# Altium footprint library ref-packages.PCBLIB: 1544 footprints (part 62 of 103)
Each footprint in its own frame and in the unit in brackets; x right, y up, seen from the top. Pads: shape width x height; smd on the part's side, far side on the other; paste and mask are expansions set on the pad; w line width, h text height; cw(c..) or ccw(c..) is an arc to the next point about the centre after c.
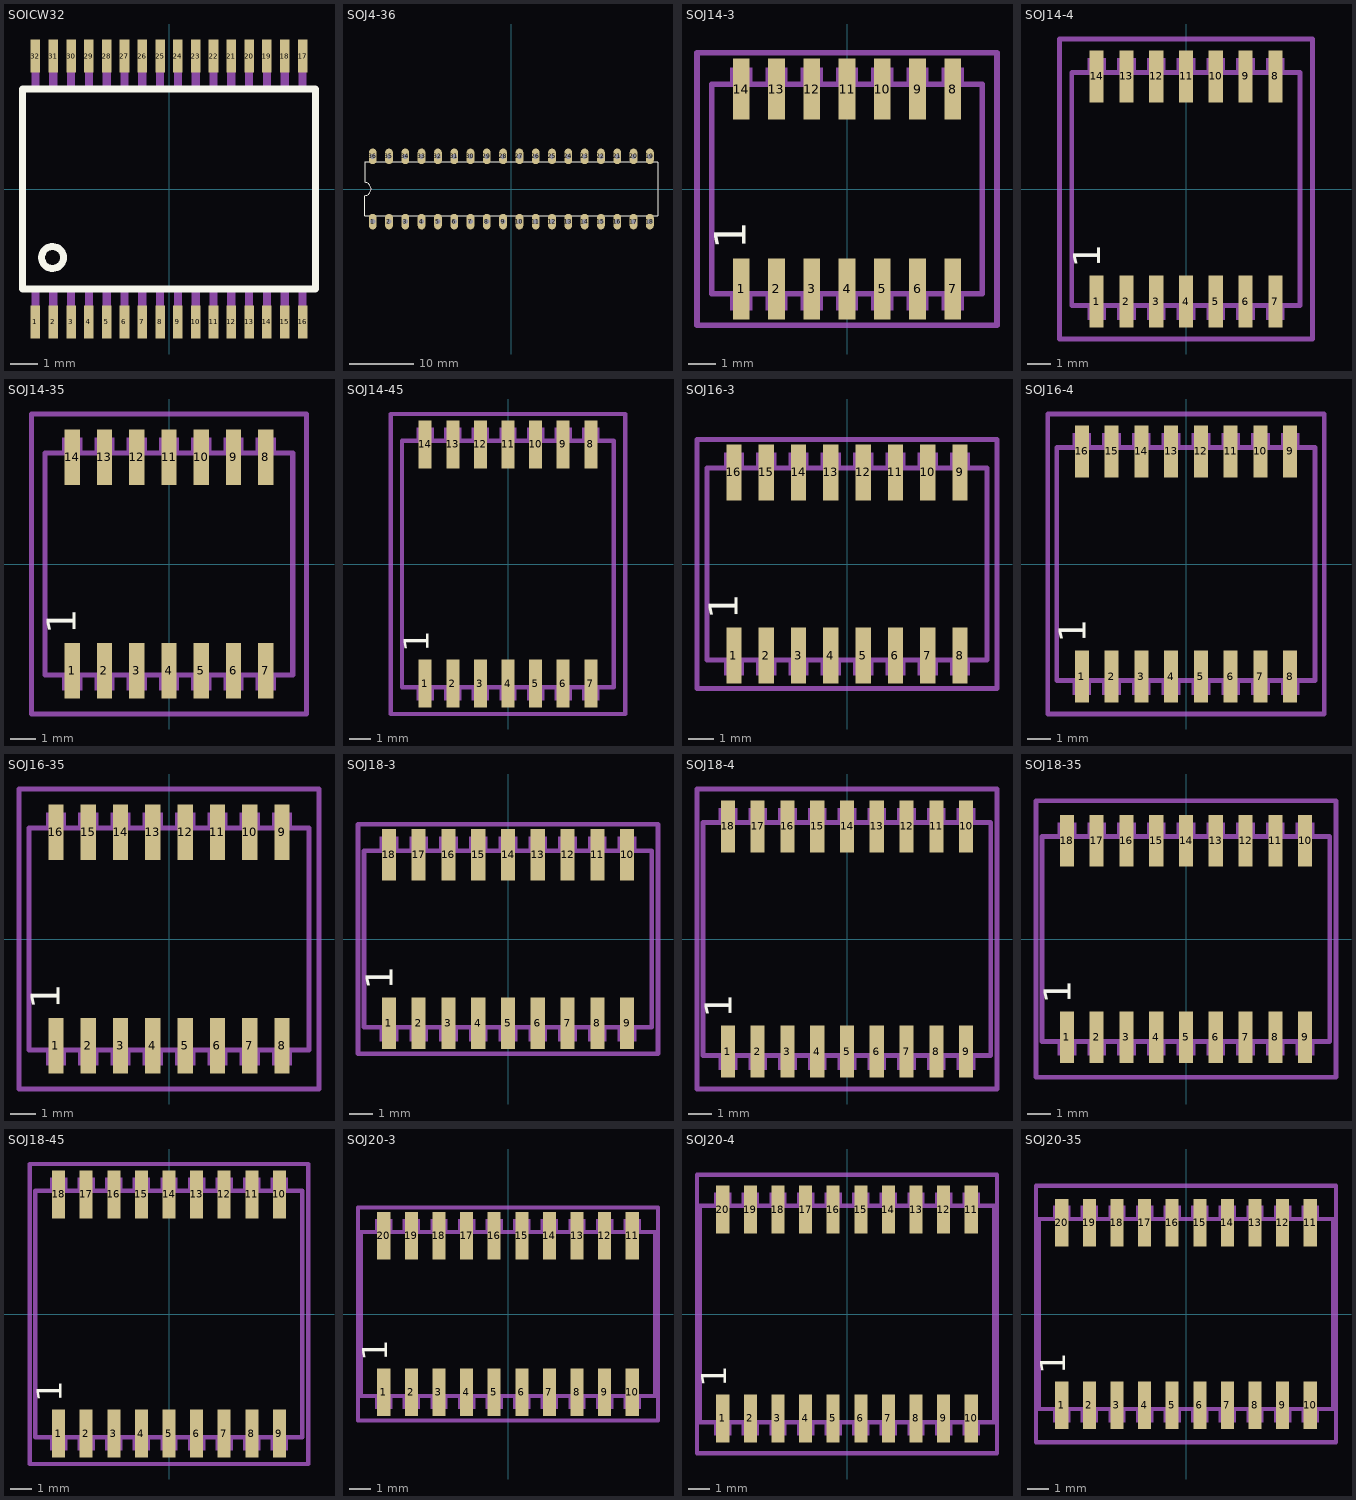
[diagram p61: the footprints below, top view; thin cyan lines are the x and y axes]

## SOICW32 [mm]
pads (32):
  rect 0.35x1.2 smd: 1(-4.875,-4.85) 2(-4.225,-4.85) 3(-3.575,-4.85) 4(-2.925,-4.85) 5(-2.275,-4.85) 6(-1.625,-4.85) 7(-0.975,-4.85) 8(-0.325,-4.85) 9(0.325,-4.85) 10(0.975,-4.85) 11(1.625,-4.85) 12(2.275,-4.85) 13(2.925,-4.85) 14(3.575,-4.85) 15(4.225,-4.85) 16(4.875,-4.85) 17(4.875,4.85) 18(4.225,4.85) 19(3.575,4.85) 20(2.925,4.85) 21(2.275,4.85) 22(1.625,4.85) 23(0.975,4.85) 24(0.325,4.85) 25(-0.325,4.85) 26(-0.975,4.85) 27(-1.625,4.85) 28(-2.275,4.85) 29(-2.925,4.85) 30(-3.575,4.85) 31(-4.225,4.85) 32(-4.875,4.85)
Top Overlay:
  circle w0.254: c-4.25,-2.5 r0.4
  lines w0.254: -5.35,-3.65 5.35,-3.65 5.35,3.65 -5.35,3.65 -5.35,-3.65
Mechanical 16:
  rectangle: -5.025,-5.15 -4.725,-3.75
  rectangle: -4.375,-5.15 -4.075,-3.75
  rectangle: -3.725,-5.15 -3.425,-3.75
  rectangle: -3.075,-5.15 -2.775,-3.75
  rectangle: -2.425,-5.15 -2.125,-3.75
  rectangle: -1.775,-5.15 -1.475,-3.75
  rectangle: -1.125,-5.15 -0.825,-3.75
  rectangle: -0.475,-5.15 -0.175,-3.75
  rectangle: 0.175,-5.15 0.475,-3.75
  rectangle: 0.825,-5.15 1.125,-3.75
  rectangle: 1.475,-5.15 1.775,-3.75
  rectangle: 2.125,-5.15 2.425,-3.75
  rectangle: 2.775,-5.15 3.075,-3.75
  rectangle: 3.425,-5.15 3.725,-3.75
  rectangle: 4.075,-5.15 4.375,-3.75
  rectangle: 4.725,-5.15 5.025,-3.75
  rectangle: 4.725,3.75 5.025,5.15
  rectangle: 4.075,3.75 4.375,5.15
  rectangle: 3.425,3.75 3.725,5.15
  rectangle: 2.775,3.75 3.075,5.15
  rectangle: 2.125,3.75 2.425,5.15
  rectangle: 1.475,3.75 1.775,5.15
  rectangle: 0.825,3.75 1.125,5.15
  rectangle: 0.175,3.75 0.475,5.15
  rectangle: -0.475,3.75 -0.175,5.15
  rectangle: -1.125,3.75 -0.825,5.15
  rectangle: -1.775,3.75 -1.475,5.15
  rectangle: -2.425,3.75 -2.125,5.15
  rectangle: -3.075,3.75 -2.775,5.15
  rectangle: -3.725,3.75 -3.425,5.15
  rectangle: -4.375,3.75 -4.075,5.15
  rectangle: -5.025,3.75 -4.725,5.15

## SOJ4-36 [mil]
pads (36):
  oval 48x96 hole 32: 1(-850,-200) 2(-750,-200) 3(-650,-200) 4(-550,-200) 5(-450,-200) 6(-350,-200) 7(-250,-200) 8(-150,-200) 9(-50,-200) 10(50,-200) 11(150,-200) 12(250,-200) 13(350,-200) 14(450,-200) 15(550,-200) 16(650,-200) 17(750,-200) 18(850,-200) 19(850,200) 20(750,200) 21(650,200) 22(550,200) 23(450,200) 24(350,200) 25(250,200) 26(150,200) 27(50,200) 28(-50,200) 29(-150,200) 30(-250,200) 31(-350,200) 32(-450,200) 33(-550,200) 34(-650,200) 35(-750,200) 36(-850,200)
Top Overlay:
  lines w6: -900,-165 900,-165 900,165 -900,165 -900,40 cw(c-900,0) -900,-40 -900,-165

## SOJ14-3 [mil]
pads (14):
  rect 23.62x86.61 smd: 1(-150,-141.73) 2(-100,-141.73) 3(-50,-141.73) 4(0,-141.73) 5(50,-141.73) 6(100,-141.73) 7(150,-141.73) 8(150,141.73) 9(100,141.73) 10(50,141.73) 11(0,141.73) 12(-50,141.73) 13(-100,141.73) 14(-150,141.73)
Top Overlay:
  text "1" at -128.54,-85.43 h77.5
Mechanical 16:
  rectangle: -159.84,-144.49 -140.16,-99.61
  rectangle: -165.75,-172.44 -134.25,-152.36
  rectangle: -109.84,-144.49 -90.16,-99.61
  rectangle: -115.75,-172.44 -84.25,-152.36
  rectangle: -59.84,-144.49 -40.16,-99.61
  rectangle: -65.75,-172.44 -34.25,-152.36
  rectangle: -9.84,-144.49 9.84,-99.61
  rectangle: -15.75,-172.44 15.75,-152.36
  rectangle: 40.16,-144.49 59.84,-99.61
  rectangle: 34.25,-172.44 65.75,-152.36
  rectangle: 90.16,-144.49 109.84,-99.61
  rectangle: 84.25,-172.44 115.75,-152.36
  rectangle: 140.16,-144.49 159.84,-99.61
  rectangle: 134.25,-172.44 165.75,-152.36
  rectangle: 140.16,99.61 159.84,144.49
  rectangle: 134.25,152.36 165.75,172.44
  rectangle: 90.16,99.61 109.84,144.49
  rectangle: 84.25,152.36 115.75,172.44
  rectangle: 40.16,99.61 59.84,144.49
  rectangle: 34.25,152.36 65.75,172.44
  rectangle: -9.84,99.61 9.84,144.49
  rectangle: -15.75,152.36 15.75,172.44
  rectangle: -59.84,99.61 -40.16,144.49
  rectangle: -65.75,152.36 -34.25,172.44
  rectangle: -109.84,99.61 -90.16,144.49
  rectangle: -115.75,152.36 -84.25,172.44
  rectangle: -159.84,99.61 -140.16,144.49
  rectangle: -165.75,152.36 -134.25,172.44
  lines w8: -191.93,-148.43 191.54,-148.43 191.54,148.43 -191.93,148.43 -191.93,-148.43
Mechanical 27:
  lines w7.87: -212.6,-192.91 -212.6,192.91 212.6,192.91 212.6,-192.91 -212.6,-192.91

## SOJ14-4 [mil]
pads (14):
  rect 23.62x86.61 smd: 1(-150,-188.98) 2(-100,-188.98) 3(-50,-188.98) 4(0,-188.98) 5(50,-188.98) 6(100,-188.98) 7(150,-188.98) 8(150,188.98) 9(100,188.98) 10(50,188.98) 11(0,188.98) 12(-50,188.98) 13(-100,188.98) 14(-150,188.98)
Top Overlay:
  text "1" at -128.54,-132.68 h77.5
Mechanical 16:
  rectangle: -159.84,-191.73 -140.16,-146.85
  rectangle: -165.75,-219.69 -134.25,-199.61
  rectangle: -109.84,-191.73 -90.16,-146.85
  rectangle: -115.75,-219.69 -84.25,-199.61
  rectangle: -59.84,-191.73 -40.16,-146.85
  rectangle: -65.75,-219.69 -34.25,-199.61
  rectangle: -9.84,-191.73 9.84,-146.85
  rectangle: -15.75,-219.69 15.75,-199.61
  rectangle: 40.16,-191.73 59.84,-146.85
  rectangle: 34.25,-219.69 65.75,-199.61
  rectangle: 90.16,-191.73 109.84,-146.85
  rectangle: 84.25,-219.69 115.75,-199.61
  rectangle: 140.16,-191.73 159.84,-146.85
  rectangle: 134.25,-219.69 165.75,-199.61
  rectangle: 140.16,146.85 159.84,191.73
  rectangle: 134.25,199.61 165.75,219.69
  rectangle: 90.16,146.85 109.84,191.73
  rectangle: 84.25,199.61 115.75,219.69
  rectangle: 40.16,146.85 59.84,191.73
  rectangle: 34.25,199.61 65.75,219.69
  rectangle: -9.84,146.85 9.84,191.73
  rectangle: -15.75,199.61 15.75,219.69
  rectangle: -59.84,146.85 -40.16,191.73
  rectangle: -65.75,199.61 -34.25,219.69
  rectangle: -109.84,146.85 -90.16,191.73
  rectangle: -115.75,199.61 -84.25,219.69
  rectangle: -159.84,146.85 -140.16,191.73
  rectangle: -165.75,199.61 -134.25,219.69
  lines w8: -191.93,-195.67 191.54,-195.67 191.54,195.67 -191.93,195.67 -191.93,-195.67
Mechanical 27:
  lines w7.87: -212.6,-251.97 -212.6,251.97 212.6,251.97 212.6,-251.97 -212.6,-251.97

## SOJ14-35 [mil]
pads (14):
  rect 23.62x86.61 smd: 1(-150,-165.35) 2(-100,-165.35) 3(-50,-165.35) 4(0,-165.35) 5(50,-165.35) 6(100,-165.35) 7(150,-165.35) 8(150,165.35) 9(100,165.35) 10(50,165.35) 11(0,165.35) 12(-50,165.35) 13(-100,165.35) 14(-150,165.35)
Top Overlay:
  text "1" at -128.54,-109.06 h77.5
Mechanical 16:
  rectangle: -159.84,-168.11 -140.16,-123.23
  rectangle: -165.75,-196.06 -134.25,-175.98
  rectangle: -109.84,-168.11 -90.16,-123.23
  rectangle: -115.75,-196.06 -84.25,-175.98
  rectangle: -59.84,-168.11 -40.16,-123.23
  rectangle: -65.75,-196.06 -34.25,-175.98
  rectangle: -9.84,-168.11 9.84,-123.23
  rectangle: -15.75,-196.06 15.75,-175.98
  rectangle: 40.16,-168.11 59.84,-123.23
  rectangle: 34.25,-196.06 65.75,-175.98
  rectangle: 90.16,-168.11 109.84,-123.23
  rectangle: 84.25,-196.06 115.75,-175.98
  rectangle: 140.16,-168.11 159.84,-123.23
  rectangle: 134.25,-196.06 165.75,-175.98
  rectangle: 140.16,123.23 159.84,168.11
  rectangle: 134.25,175.98 165.75,196.06
  rectangle: 90.16,123.23 109.84,168.11
  rectangle: 84.25,175.98 115.75,196.06
  rectangle: 40.16,123.23 59.84,168.11
  rectangle: 34.25,175.98 65.75,196.06
  rectangle: -9.84,123.23 9.84,168.11
  rectangle: -15.75,175.98 15.75,196.06
  rectangle: -59.84,123.23 -40.16,168.11
  rectangle: -65.75,175.98 -34.25,196.06
  rectangle: -109.84,123.23 -90.16,168.11
  rectangle: -115.75,175.98 -84.25,196.06
  rectangle: -159.84,123.23 -140.16,168.11
  rectangle: -165.75,175.98 -134.25,196.06
  lines w8: -191.93,-172.05 191.54,-172.05 191.54,172.05 -191.93,172.05 -191.93,-172.05
Mechanical 27:
  lines w7.87: -212.6,-232.28 -212.6,232.28 212.6,232.28 212.6,-232.28 -212.6,-232.28

## SOJ14-45 [mil]
pads (14):
  rect 23.62x86.61 smd: 1(-150,-216.54) 2(-100,-216.54) 3(-50,-216.54) 4(0,-216.54) 5(50,-216.54) 6(100,-216.54) 7(150,-216.54) 8(150,216.54) 9(100,216.54) 10(50,216.54) 11(0,216.54) 12(-50,216.54) 13(-100,216.54) 14(-150,216.54)
Top Overlay:
  text "1" at -128.54,-160.24 h77.5
Mechanical 16:
  rectangle: -159.84,-219.29 -140.16,-174.41
  rectangle: -165.75,-247.24 -134.25,-227.17
  rectangle: -109.84,-219.29 -90.16,-174.41
  rectangle: -115.75,-247.24 -84.25,-227.17
  rectangle: -59.84,-219.29 -40.16,-174.41
  rectangle: -65.75,-247.24 -34.25,-227.17
  rectangle: -9.84,-219.29 9.84,-174.41
  rectangle: -15.75,-247.24 15.75,-227.17
  rectangle: 40.16,-219.29 59.84,-174.41
  rectangle: 34.25,-247.24 65.75,-227.17
  rectangle: 90.16,-219.29 109.84,-174.41
  rectangle: 84.25,-247.24 115.75,-227.17
  rectangle: 140.16,-219.29 159.84,-174.41
  rectangle: 134.25,-247.24 165.75,-227.17
  rectangle: 140.16,174.41 159.84,219.29
  rectangle: 134.25,227.17 165.75,247.24
  rectangle: 90.16,174.41 109.84,219.29
  rectangle: 84.25,227.17 115.75,247.24
  rectangle: 40.16,174.41 59.84,219.29
  rectangle: 34.25,227.17 65.75,247.24
  rectangle: -9.84,174.41 9.84,219.29
  rectangle: -15.75,227.17 15.75,247.24
  rectangle: -59.84,174.41 -40.16,219.29
  rectangle: -65.75,227.17 -34.25,247.24
  rectangle: -109.84,174.41 -90.16,219.29
  rectangle: -115.75,227.17 -84.25,247.24
  rectangle: -159.84,174.41 -140.16,219.29
  rectangle: -165.75,227.17 -134.25,247.24
  lines w8: -191.93,-223.23 191.54,-223.23 191.54,223.23 -191.93,223.23 -191.93,-223.23
Mechanical 27:
  lines w7.87: -212.6,-271.65 -212.6,271.65 212.6,271.65 212.6,-271.65 -212.6,-271.65

## SOJ16-3 [mil]
pads (16):
  rect 23.62x86.61 smd: 1(-175,-141.73) 2(-125,-141.73) 3(-75,-141.73) 4(-25,-141.73) 5(25,-141.73) 6(75,-141.73) 7(125,-141.73) 8(175,-141.73) 9(175,141.73) 10(125,141.73) 11(75,141.73) 12(25,141.73) 13(-25,141.73) 14(-75,141.73) 15(-125,141.73) 16(-175,141.73)
Top Overlay:
  text "1" at -153.54,-85.43 h77.5
Mechanical 16:
  rectangle: -184.84,-144.49 -165.16,-99.61
  rectangle: -190.75,-172.44 -159.25,-152.36
  rectangle: -134.84,-144.49 -115.16,-99.61
  rectangle: -140.75,-172.44 -109.25,-152.36
  rectangle: -84.84,-144.49 -65.16,-99.61
  rectangle: -90.75,-172.44 -59.25,-152.36
  rectangle: -34.84,-144.49 -15.16,-99.61
  rectangle: -40.75,-172.44 -9.25,-152.36
  rectangle: 15.16,-144.49 34.84,-99.61
  rectangle: 9.25,-172.44 40.75,-152.36
  rectangle: 65.16,-144.49 84.84,-99.61
  rectangle: 59.25,-172.44 90.75,-152.36
  rectangle: 115.16,-144.49 134.84,-99.61
  rectangle: 109.25,-172.44 140.75,-152.36
  rectangle: 165.16,-144.49 184.84,-99.61
  rectangle: 159.25,-172.44 190.75,-152.36
  rectangle: 165.16,99.61 184.84,144.49
  rectangle: 159.25,152.36 190.75,172.44
  rectangle: 115.16,99.61 134.84,144.49
  rectangle: 109.25,152.36 140.75,172.44
  rectangle: 65.16,99.61 84.84,144.49
  rectangle: 59.25,152.36 90.75,172.44
  rectangle: 15.16,99.61 34.84,144.49
  rectangle: 9.25,152.36 40.75,172.44
  rectangle: -34.84,99.61 -15.16,144.49
  rectangle: -40.75,152.36 -9.25,172.44
  rectangle: -84.84,99.61 -65.16,144.49
  rectangle: -90.75,152.36 -59.25,172.44
  rectangle: -134.84,99.61 -115.16,144.49
  rectangle: -140.75,152.36 -109.25,172.44
  rectangle: -184.84,99.61 -165.16,144.49
  rectangle: -190.75,152.36 -159.25,172.44
  lines w8: -216.93,-148.43 216.54,-148.43 216.54,148.43 -216.93,148.43 -216.93,-148.43
Mechanical 27:
  lines w7.87: -232.28,-192.91 -232.28,192.91 232.28,192.91 232.28,-192.91 -232.28,-192.91

## SOJ16-4 [mil]
pads (16):
  rect 23.62x86.61 smd: 1(-175,-188.98) 2(-125,-188.98) 3(-75,-188.98) 4(-25,-188.98) 5(25,-188.98) 6(75,-188.98) 7(125,-188.98) 8(175,-188.98) 9(175,188.98) 10(125,188.98) 11(75,188.98) 12(25,188.98) 13(-25,188.98) 14(-75,188.98) 15(-125,188.98) 16(-175,188.98)
Top Overlay:
  text "1" at -153.54,-132.68 h77.5
Mechanical 16:
  rectangle: -184.84,-191.73 -165.16,-146.85
  rectangle: -190.75,-219.69 -159.25,-199.61
  rectangle: -134.84,-191.73 -115.16,-146.85
  rectangle: -140.75,-219.69 -109.25,-199.61
  rectangle: -84.84,-191.73 -65.16,-146.85
  rectangle: -90.75,-219.69 -59.25,-199.61
  rectangle: -34.84,-191.73 -15.16,-146.85
  rectangle: -40.75,-219.69 -9.25,-199.61
  rectangle: 15.16,-191.73 34.84,-146.85
  rectangle: 9.25,-219.69 40.75,-199.61
  rectangle: 65.16,-191.73 84.84,-146.85
  rectangle: 59.25,-219.69 90.75,-199.61
  rectangle: 115.16,-191.73 134.84,-146.85
  rectangle: 109.25,-219.69 140.75,-199.61
  rectangle: 165.16,-191.73 184.84,-146.85
  rectangle: 159.25,-219.69 190.75,-199.61
  rectangle: 165.16,146.85 184.84,191.73
  rectangle: 159.25,199.61 190.75,219.69
  rectangle: 115.16,146.85 134.84,191.73
  rectangle: 109.25,199.61 140.75,219.69
  rectangle: 65.16,146.85 84.84,191.73
  rectangle: 59.25,199.61 90.75,219.69
  rectangle: 15.16,146.85 34.84,191.73
  rectangle: 9.25,199.61 40.75,219.69
  rectangle: -34.84,146.85 -15.16,191.73
  rectangle: -40.75,199.61 -9.25,219.69
  rectangle: -84.84,146.85 -65.16,191.73
  rectangle: -90.75,199.61 -59.25,219.69
  rectangle: -134.84,146.85 -115.16,191.73
  rectangle: -140.75,199.61 -109.25,219.69
  rectangle: -184.84,146.85 -165.16,191.73
  rectangle: -190.75,199.61 -159.25,219.69
  lines w8: -216.93,-195.67 216.54,-195.67 216.54,195.67 -216.93,195.67 -216.93,-195.67
Mechanical 27:
  lines w7.87: -232.28,-251.97 -232.28,251.97 232.28,251.97 232.28,-251.97 -232.28,-251.97

## SOJ16-35 [mil]
pads (16):
  rect 23.62x86.61 smd: 1(-175,-165.35) 2(-125,-165.35) 3(-75,-165.35) 4(-25,-165.35) 5(25,-165.35) 6(75,-165.35) 7(125,-165.35) 8(175,-165.35) 9(175,165.35) 10(125,165.35) 11(75,165.35) 12(25,165.35) 13(-25,165.35) 14(-75,165.35) 15(-125,165.35) 16(-175,165.35)
Top Overlay:
  text "1" at -153.54,-109.06 h77.5
Mechanical 16:
  rectangle: -184.84,-168.11 -165.16,-123.23
  rectangle: -190.75,-196.06 -159.25,-175.98
  rectangle: -134.84,-168.11 -115.16,-123.23
  rectangle: -140.75,-196.06 -109.25,-175.98
  rectangle: -84.84,-168.11 -65.16,-123.23
  rectangle: -90.75,-196.06 -59.25,-175.98
  rectangle: -34.84,-168.11 -15.16,-123.23
  rectangle: -40.75,-196.06 -9.25,-175.98
  rectangle: 15.16,-168.11 34.84,-123.23
  rectangle: 9.25,-196.06 40.75,-175.98
  rectangle: 65.16,-168.11 84.84,-123.23
  rectangle: 59.25,-196.06 90.75,-175.98
  rectangle: 115.16,-168.11 134.84,-123.23
  rectangle: 109.25,-196.06 140.75,-175.98
  rectangle: 165.16,-168.11 184.84,-123.23
  rectangle: 159.25,-196.06 190.75,-175.98
  rectangle: 165.16,123.23 184.84,168.11
  rectangle: 159.25,175.98 190.75,196.06
  rectangle: 115.16,123.23 134.84,168.11
  rectangle: 109.25,175.98 140.75,196.06
  rectangle: 65.16,123.23 84.84,168.11
  rectangle: 59.25,175.98 90.75,196.06
  rectangle: 15.16,123.23 34.84,168.11
  rectangle: 9.25,175.98 40.75,196.06
  rectangle: -34.84,123.23 -15.16,168.11
  rectangle: -40.75,175.98 -9.25,196.06
  rectangle: -84.84,123.23 -65.16,168.11
  rectangle: -90.75,175.98 -59.25,196.06
  rectangle: -134.84,123.23 -115.16,168.11
  rectangle: -140.75,175.98 -109.25,196.06
  rectangle: -184.84,123.23 -165.16,168.11
  rectangle: -190.75,175.98 -159.25,196.06
  lines w8: -216.93,-172.05 216.54,-172.05 216.54,172.05 -216.93,172.05 -216.93,-172.05
Mechanical 27:
  lines w7.87: -232.28,-232.28 -232.28,232.28 232.28,232.28 232.28,-232.28 -232.28,-232.28

## SOJ18-3 [mil]
pads (18):
  rect 23.62x86.61 smd: 1(-200,-141.73) 2(-150,-141.73) 3(-100,-141.73) 4(-50,-141.73) 5(0,-141.73) 6(50,-141.73) 7(100,-141.73) 8(150,-141.73) 9(200,-141.73) 10(200,141.73) 11(150,141.73) 12(100,141.73) 13(50,141.73) 14(0,141.73) 15(-50,141.73) 16(-100,141.73) 17(-150,141.73) 18(-200,141.73)
Top Overlay:
  text "1" at -178.54,-85.43 h77.5
Mechanical 16:
  rectangle: -209.84,-144.49 -190.16,-99.61
  rectangle: -215.75,-172.44 -184.25,-152.36
  rectangle: -159.84,-144.49 -140.16,-99.61
  rectangle: -165.75,-172.44 -134.25,-152.36
  rectangle: -109.84,-144.49 -90.16,-99.61
  rectangle: -115.75,-172.44 -84.25,-152.36
  rectangle: -59.84,-144.49 -40.16,-99.61
  rectangle: -65.75,-172.44 -34.25,-152.36
  rectangle: -9.84,-144.49 9.84,-99.61
  rectangle: -15.75,-172.44 15.75,-152.36
  rectangle: 40.16,-144.49 59.84,-99.61
  rectangle: 34.25,-172.44 65.75,-152.36
  rectangle: 90.16,-144.49 109.84,-99.61
  rectangle: 84.25,-172.44 115.75,-152.36
  rectangle: 140.16,-144.49 159.84,-99.61
  rectangle: 134.25,-172.44 165.75,-152.36
  rectangle: 190.16,-144.49 209.84,-99.61
  rectangle: 184.25,-172.44 215.75,-152.36
  rectangle: 190.16,99.61 209.84,144.49
  rectangle: 184.25,152.36 215.75,172.44
  rectangle: 140.16,99.61 159.84,144.49
  rectangle: 134.25,152.36 165.75,172.44
  rectangle: 90.16,99.61 109.84,144.49
  rectangle: 84.25,152.36 115.75,172.44
  rectangle: 40.16,99.61 59.84,144.49
  rectangle: 34.25,152.36 65.75,172.44
  rectangle: -9.84,99.61 9.84,144.49
  rectangle: -15.75,152.36 15.75,172.44
  rectangle: -59.84,99.61 -40.16,144.49
  rectangle: -65.75,152.36 -34.25,172.44
  rectangle: -109.84,99.61 -90.16,144.49
  rectangle: -115.75,152.36 -84.25,172.44
  rectangle: -159.84,99.61 -140.16,144.49
  rectangle: -165.75,152.36 -134.25,172.44
  rectangle: -209.84,99.61 -190.16,144.49
  rectangle: -215.75,152.36 -184.25,172.44
  lines w8: -241.93,-148.43 241.54,-148.43 241.54,148.43 -241.93,148.43 -241.93,-148.43
Mechanical 27:
  lines w7.87: -251.97,-192.91 -251.97,192.91 251.97,192.91 251.97,-192.91 -251.97,-192.91

## SOJ18-4 [mil]
pads (18):
  rect 23.62x86.61 smd: 1(-200,-188.98) 2(-150,-188.98) 3(-100,-188.98) 4(-50,-188.98) 5(0,-188.98) 6(50,-188.98) 7(100,-188.98) 8(150,-188.98) 9(200,-188.98) 10(200,188.98) 11(150,188.98) 12(100,188.98) 13(50,188.98) 14(0,188.98) 15(-50,188.98) 16(-100,188.98) 17(-150,188.98) 18(-200,188.98)
Top Overlay:
  text "1" at -178.54,-132.68 h77.5
Mechanical 16:
  rectangle: -209.84,-191.73 -190.16,-146.85
  rectangle: -215.75,-219.69 -184.25,-199.61
  rectangle: -159.84,-191.73 -140.16,-146.85
  rectangle: -165.75,-219.69 -134.25,-199.61
  rectangle: -109.84,-191.73 -90.16,-146.85
  rectangle: -115.75,-219.69 -84.25,-199.61
  rectangle: -59.84,-191.73 -40.16,-146.85
  rectangle: -65.75,-219.69 -34.25,-199.61
  rectangle: -9.84,-191.73 9.84,-146.85
  rectangle: -15.75,-219.69 15.75,-199.61
  rectangle: 40.16,-191.73 59.84,-146.85
  rectangle: 34.25,-219.69 65.75,-199.61
  rectangle: 90.16,-191.73 109.84,-146.85
  rectangle: 84.25,-219.69 115.75,-199.61
  rectangle: 140.16,-191.73 159.84,-146.85
  rectangle: 134.25,-219.69 165.75,-199.61
  rectangle: 190.16,-191.73 209.84,-146.85
  rectangle: 184.25,-219.69 215.75,-199.61
  rectangle: 190.16,146.85 209.84,191.73
  rectangle: 184.25,199.61 215.75,219.69
  rectangle: 140.16,146.85 159.84,191.73
  rectangle: 134.25,199.61 165.75,219.69
  rectangle: 90.16,146.85 109.84,191.73
  rectangle: 84.25,199.61 115.75,219.69
  rectangle: 40.16,146.85 59.84,191.73
  rectangle: 34.25,199.61 65.75,219.69
  rectangle: -9.84,146.85 9.84,191.73
  rectangle: -15.75,199.61 15.75,219.69
  rectangle: -59.84,146.85 -40.16,191.73
  rectangle: -65.75,199.61 -34.25,219.69
  rectangle: -109.84,146.85 -90.16,191.73
  rectangle: -115.75,199.61 -84.25,219.69
  rectangle: -159.84,146.85 -140.16,191.73
  rectangle: -165.75,199.61 -134.25,219.69
  rectangle: -209.84,146.85 -190.16,191.73
  rectangle: -215.75,199.61 -184.25,219.69
  lines w8: -241.93,-195.67 241.54,-195.67 241.54,195.67 -241.93,195.67 -241.93,-195.67
Mechanical 27:
  lines w7.87: -251.97,-251.97 -251.97,251.97 251.97,251.97 251.97,-251.97 -251.97,-251.97

## SOJ18-35 [mil]
pads (18):
  rect 23.62x86.61 smd: 1(-200,-165.35) 2(-150,-165.35) 3(-100,-165.35) 4(-50,-165.35) 5(0,-165.35) 6(50,-165.35) 7(100,-165.35) 8(150,-165.35) 9(200,-165.35) 10(200,165.35) 11(150,165.35) 12(100,165.35) 13(50,165.35) 14(0,165.35) 15(-50,165.35) 16(-100,165.35) 17(-150,165.35) 18(-200,165.35)
Top Overlay:
  text "1" at -178.54,-109.06 h77.5
Mechanical 16:
  rectangle: -209.84,-168.11 -190.16,-123.23
  rectangle: -215.75,-196.06 -184.25,-175.98
  rectangle: -159.84,-168.11 -140.16,-123.23
  rectangle: -165.75,-196.06 -134.25,-175.98
  rectangle: -109.84,-168.11 -90.16,-123.23
  rectangle: -115.75,-196.06 -84.25,-175.98
  rectangle: -59.84,-168.11 -40.16,-123.23
  rectangle: -65.75,-196.06 -34.25,-175.98
  rectangle: -9.84,-168.11 9.84,-123.23
  rectangle: -15.75,-196.06 15.75,-175.98
  rectangle: 40.16,-168.11 59.84,-123.23
  rectangle: 34.25,-196.06 65.75,-175.98
  rectangle: 90.16,-168.11 109.84,-123.23
  rectangle: 84.25,-196.06 115.75,-175.98
  rectangle: 140.16,-168.11 159.84,-123.23
  rectangle: 134.25,-196.06 165.75,-175.98
  rectangle: 190.16,-168.11 209.84,-123.23
  rectangle: 184.25,-196.06 215.75,-175.98
  rectangle: 190.16,123.23 209.84,168.11
  rectangle: 184.25,175.98 215.75,196.06
  rectangle: 140.16,123.23 159.84,168.11
  rectangle: 134.25,175.98 165.75,196.06
  rectangle: 90.16,123.23 109.84,168.11
  rectangle: 84.25,175.98 115.75,196.06
  rectangle: 40.16,123.23 59.84,168.11
  rectangle: 34.25,175.98 65.75,196.06
  rectangle: -9.84,123.23 9.84,168.11
  rectangle: -15.75,175.98 15.75,196.06
  rectangle: -59.84,123.23 -40.16,168.11
  rectangle: -65.75,175.98 -34.25,196.06
  rectangle: -109.84,123.23 -90.16,168.11
  rectangle: -115.75,175.98 -84.25,196.06
  rectangle: -159.84,123.23 -140.16,168.11
  rectangle: -165.75,175.98 -134.25,196.06
  rectangle: -209.84,123.23 -190.16,168.11
  rectangle: -215.75,175.98 -184.25,196.06
  lines w8: -241.93,-172.05 241.54,-172.05 241.54,172.05 -241.93,172.05 -241.93,-172.05
Mechanical 27:
  lines w7.87: -251.97,-232.28 -251.97,232.28 251.97,232.28 251.97,-232.28 -251.97,-232.28

## SOJ18-45 [mil]
pads (18):
  rect 23.62x86.61 smd: 1(-200,-216.54) 2(-150,-216.54) 3(-100,-216.54) 4(-50,-216.54) 5(0,-216.54) 6(50,-216.54) 7(100,-216.54) 8(150,-216.54) 9(200,-216.54) 10(200,216.54) 11(150,216.54) 12(100,216.54) 13(50,216.54) 14(0,216.54) 15(-50,216.54) 16(-100,216.54) 17(-150,216.54) 18(-200,216.54)
Top Overlay:
  text "1" at -178.54,-160.24 h77.5
Mechanical 16:
  rectangle: -209.84,-219.29 -190.16,-174.41
  rectangle: -215.75,-247.24 -184.25,-227.17
  rectangle: -159.84,-219.29 -140.16,-174.41
  rectangle: -165.75,-247.24 -134.25,-227.17
  rectangle: -109.84,-219.29 -90.16,-174.41
  rectangle: -115.75,-247.24 -84.25,-227.17
  rectangle: -59.84,-219.29 -40.16,-174.41
  rectangle: -65.75,-247.24 -34.25,-227.17
  rectangle: -9.84,-219.29 9.84,-174.41
  rectangle: -15.75,-247.24 15.75,-227.17
  rectangle: 40.16,-219.29 59.84,-174.41
  rectangle: 34.25,-247.24 65.75,-227.17
  rectangle: 90.16,-219.29 109.84,-174.41
  rectangle: 84.25,-247.24 115.75,-227.17
  rectangle: 140.16,-219.29 159.84,-174.41
  rectangle: 134.25,-247.24 165.75,-227.17
  rectangle: 190.16,-219.29 209.84,-174.41
  rectangle: 184.25,-247.24 215.75,-227.17
  rectangle: 190.16,174.41 209.84,219.29
  rectangle: 184.25,227.17 215.75,247.24
  rectangle: 140.16,174.41 159.84,219.29
  rectangle: 134.25,227.17 165.75,247.24
  rectangle: 90.16,174.41 109.84,219.29
  rectangle: 84.25,227.17 115.75,247.24
  rectangle: 40.16,174.41 59.84,219.29
  rectangle: 34.25,227.17 65.75,247.24
  rectangle: -9.84,174.41 9.84,219.29
  rectangle: -15.75,227.17 15.75,247.24
  rectangle: -59.84,174.41 -40.16,219.29
  rectangle: -65.75,227.17 -34.25,247.24
  rectangle: -109.84,174.41 -90.16,219.29
  rectangle: -115.75,227.17 -84.25,247.24
  rectangle: -159.84,174.41 -140.16,219.29
  rectangle: -165.75,227.17 -134.25,247.24
  rectangle: -209.84,174.41 -190.16,219.29
  rectangle: -215.75,227.17 -184.25,247.24
  lines w8: -241.93,-223.23 241.54,-223.23 241.54,223.23 -241.93,223.23 -241.93,-223.23
Mechanical 27:
  lines w7.87: -251.97,-271.65 -251.97,271.65 251.97,271.65 251.97,-271.65 -251.97,-271.65

## SOJ20-3 [mil]
pads (20):
  rect 23.62x86.61 smd: 1(-225,-141.73) 2(-175,-141.73) 3(-125,-141.73) 4(-75,-141.73) 5(-25,-141.73) 6(25,-141.73) 7(75,-141.73) 8(125,-141.73) 9(175,-141.73) 10(225,-141.73) 11(225,141.73) 12(175,141.73) 13(125,141.73) 14(75,141.73) 15(25,141.73) 16(-25,141.73) 17(-75,141.73) 18(-125,141.73) 19(-175,141.73) 20(-225,141.73)
Top Overlay:
  text "1" at -203.54,-85.43 h77.5
Mechanical 16:
  rectangle: -234.84,-144.49 -215.16,-99.61
  rectangle: -240.75,-172.44 -209.25,-152.36
  rectangle: -184.84,-144.49 -165.16,-99.61
  rectangle: -190.75,-172.44 -159.25,-152.36
  rectangle: -134.84,-144.49 -115.16,-99.61
  rectangle: -140.75,-172.44 -109.25,-152.36
  rectangle: -84.84,-144.49 -65.16,-99.61
  rectangle: -90.75,-172.44 -59.25,-152.36
  rectangle: -34.84,-144.49 -15.16,-99.61
  rectangle: -40.75,-172.44 -9.25,-152.36
  rectangle: 15.16,-144.49 34.84,-99.61
  rectangle: 9.25,-172.44 40.75,-152.36
  rectangle: 65.16,-144.49 84.84,-99.61
  rectangle: 59.25,-172.44 90.75,-152.36
  rectangle: 115.16,-144.49 134.84,-99.61
  rectangle: 109.25,-172.44 140.75,-152.36
  rectangle: 165.16,-144.49 184.84,-99.61
  rectangle: 159.25,-172.44 190.75,-152.36
  rectangle: 215.16,-144.49 234.84,-99.61
  rectangle: 209.25,-172.44 240.75,-152.36
  rectangle: 215.16,99.61 234.84,144.49
  rectangle: 209.25,152.36 240.75,172.44
  rectangle: 165.16,99.61 184.84,144.49
  rectangle: 159.25,152.36 190.75,172.44
  rectangle: 115.16,99.61 134.84,144.49
  rectangle: 109.25,152.36 140.75,172.44
  rectangle: 65.16,99.61 84.84,144.49
  rectangle: 59.25,152.36 90.75,172.44
  rectangle: 15.16,99.61 34.84,144.49
  rectangle: 9.25,152.36 40.75,172.44
  rectangle: -34.84,99.61 -15.16,144.49
  rectangle: -40.75,152.36 -9.25,172.44
  rectangle: -84.84,99.61 -65.16,144.49
  rectangle: -90.75,152.36 -59.25,172.44
  rectangle: -134.84,99.61 -115.16,144.49
  rectangle: -140.75,152.36 -109.25,172.44
  rectangle: -184.84,99.61 -165.16,144.49
  rectangle: -190.75,152.36 -159.25,172.44
  rectangle: -234.84,99.61 -215.16,144.49
  rectangle: -240.75,152.36 -209.25,172.44
  lines w8: -266.93,-148.43 266.54,-148.43 266.54,148.43 -266.93,148.43 -266.93,-148.43
Mechanical 27:
  lines w7.87: -271.65,-192.91 -271.65,192.91 271.65,192.91 271.65,-192.91 -271.65,-192.91

## SOJ20-4 [mil]
pads (20):
  rect 23.62x86.61 smd: 1(-225,-188.98) 2(-175,-188.98) 3(-125,-188.98) 4(-75,-188.98) 5(-25,-188.98) 6(25,-188.98) 7(75,-188.98) 8(125,-188.98) 9(175,-188.98) 10(225,-188.98) 11(225,188.98) 12(175,188.98) 13(125,188.98) 14(75,188.98) 15(25,188.98) 16(-25,188.98) 17(-75,188.98) 18(-125,188.98) 19(-175,188.98) 20(-225,188.98)
Top Overlay:
  text "1" at -203.54,-132.68 h77.5
Mechanical 16:
  rectangle: -234.84,-191.73 -215.16,-146.85
  rectangle: -240.75,-219.69 -209.25,-199.61
  rectangle: -184.84,-191.73 -165.16,-146.85
  rectangle: -190.75,-219.69 -159.25,-199.61
  rectangle: -134.84,-191.73 -115.16,-146.85
  rectangle: -140.75,-219.69 -109.25,-199.61
  rectangle: -84.84,-191.73 -65.16,-146.85
  rectangle: -90.75,-219.69 -59.25,-199.61
  rectangle: -34.84,-191.73 -15.16,-146.85
  rectangle: -40.75,-219.69 -9.25,-199.61
  rectangle: 15.16,-191.73 34.84,-146.85
  rectangle: 9.25,-219.69 40.75,-199.61
  rectangle: 65.16,-191.73 84.84,-146.85
  rectangle: 59.25,-219.69 90.75,-199.61
  rectangle: 115.16,-191.73 134.84,-146.85
  rectangle: 109.25,-219.69 140.75,-199.61
  rectangle: 165.16,-191.73 184.84,-146.85
  rectangle: 159.25,-219.69 190.75,-199.61
  rectangle: 215.16,-191.73 234.84,-146.85
  rectangle: 209.25,-219.69 240.75,-199.61
  rectangle: 215.16,146.85 234.84,191.73
  rectangle: 209.25,199.61 240.75,219.69
  rectangle: 165.16,146.85 184.84,191.73
  rectangle: 159.25,199.61 190.75,219.69
  rectangle: 115.16,146.85 134.84,191.73
  rectangle: 109.25,199.61 140.75,219.69
  rectangle: 65.16,146.85 84.84,191.73
  rectangle: 59.25,199.61 90.75,219.69
  rectangle: 15.16,146.85 34.84,191.73
  rectangle: 9.25,199.61 40.75,219.69
  rectangle: -34.84,146.85 -15.16,191.73
  rectangle: -40.75,199.61 -9.25,219.69
  rectangle: -84.84,146.85 -65.16,191.73
  rectangle: -90.75,199.61 -59.25,219.69
  rectangle: -134.84,146.85 -115.16,191.73
  rectangle: -140.75,199.61 -109.25,219.69
  rectangle: -184.84,146.85 -165.16,191.73
  rectangle: -190.75,199.61 -159.25,219.69
  rectangle: -234.84,146.85 -215.16,191.73
  rectangle: -240.75,199.61 -209.25,219.69
  lines w8: -266.93,-195.67 266.54,-195.67 266.54,195.67 -266.93,195.67 -266.93,-195.67
Mechanical 27:
  lines w7.87: -271.65,-251.97 -271.65,251.97 271.65,251.97 271.65,-251.97 -271.65,-251.97

## SOJ20-35 [mil]
pads (20):
  rect 23.62x86.61 smd: 1(-225,-165.35) 2(-175,-165.35) 3(-125,-165.35) 4(-75,-165.35) 5(-25,-165.35) 6(25,-165.35) 7(75,-165.35) 8(125,-165.35) 9(175,-165.35) 10(225,-165.35) 11(225,165.35) 12(175,165.35) 13(125,165.35) 14(75,165.35) 15(25,165.35) 16(-25,165.35) 17(-75,165.35) 18(-125,165.35) 19(-175,165.35) 20(-225,165.35)
Top Overlay:
  text "1" at -203.54,-109.06 h77.5
Mechanical 16:
  rectangle: -234.84,-168.11 -215.16,-123.23
  rectangle: -240.75,-196.06 -209.25,-175.98
  rectangle: -184.84,-168.11 -165.16,-123.23
  rectangle: -190.75,-196.06 -159.25,-175.98
  rectangle: -134.84,-168.11 -115.16,-123.23
  rectangle: -140.75,-196.06 -109.25,-175.98
  rectangle: -84.84,-168.11 -65.16,-123.23
  rectangle: -90.75,-196.06 -59.25,-175.98
  rectangle: -34.84,-168.11 -15.16,-123.23
  rectangle: -40.75,-196.06 -9.25,-175.98
  rectangle: 15.16,-168.11 34.84,-123.23
  rectangle: 9.25,-196.06 40.75,-175.98
  rectangle: 65.16,-168.11 84.84,-123.23
  rectangle: 59.25,-196.06 90.75,-175.98
  rectangle: 115.16,-168.11 134.84,-123.23
  rectangle: 109.25,-196.06 140.75,-175.98
  rectangle: 165.16,-168.11 184.84,-123.23
  rectangle: 159.25,-196.06 190.75,-175.98
  rectangle: 215.16,-168.11 234.84,-123.23
  rectangle: 209.25,-196.06 240.75,-175.98
  rectangle: 215.16,123.23 234.84,168.11
  rectangle: 209.25,175.98 240.75,196.06
  rectangle: 165.16,123.23 184.84,168.11
  rectangle: 159.25,175.98 190.75,196.06
  rectangle: 115.16,123.23 134.84,168.11
  rectangle: 109.25,175.98 140.75,196.06
  rectangle: 65.16,123.23 84.84,168.11
  rectangle: 59.25,175.98 90.75,196.06
  rectangle: 15.16,123.23 34.84,168.11
  rectangle: 9.25,175.98 40.75,196.06
  rectangle: -34.84,123.23 -15.16,168.11
  rectangle: -40.75,175.98 -9.25,196.06
  rectangle: -84.84,123.23 -65.16,168.11
  rectangle: -90.75,175.98 -59.25,196.06
  rectangle: -134.84,123.23 -115.16,168.11
  rectangle: -140.75,175.98 -109.25,196.06
  rectangle: -184.84,123.23 -165.16,168.11
  rectangle: -190.75,175.98 -159.25,196.06
  rectangle: -234.84,123.23 -215.16,168.11
  rectangle: -240.75,175.98 -209.25,196.06
  lines w8: -266.93,-172.05 266.54,-172.05 266.54,172.05 -266.93,172.05 -266.93,-172.05
Mechanical 27:
  lines w7.87: -271.65,-232.28 -271.65,232.28 271.65,232.28 271.65,-232.28 -271.65,-232.28